# Altium footprint library elk-pi-Sika_revb.PcbLib: 102 footprints (part 1 of 7)
Each footprint in its own frame and in the unit in brackets; x right, y up, seen from the top. Pads: shape width x height; smd on the part's side, far side on the other; paste and mask are expansions set on the pad; w line width, h text height; cw(c..) or ccw(c..) is an arc to the next point about the centre after c.
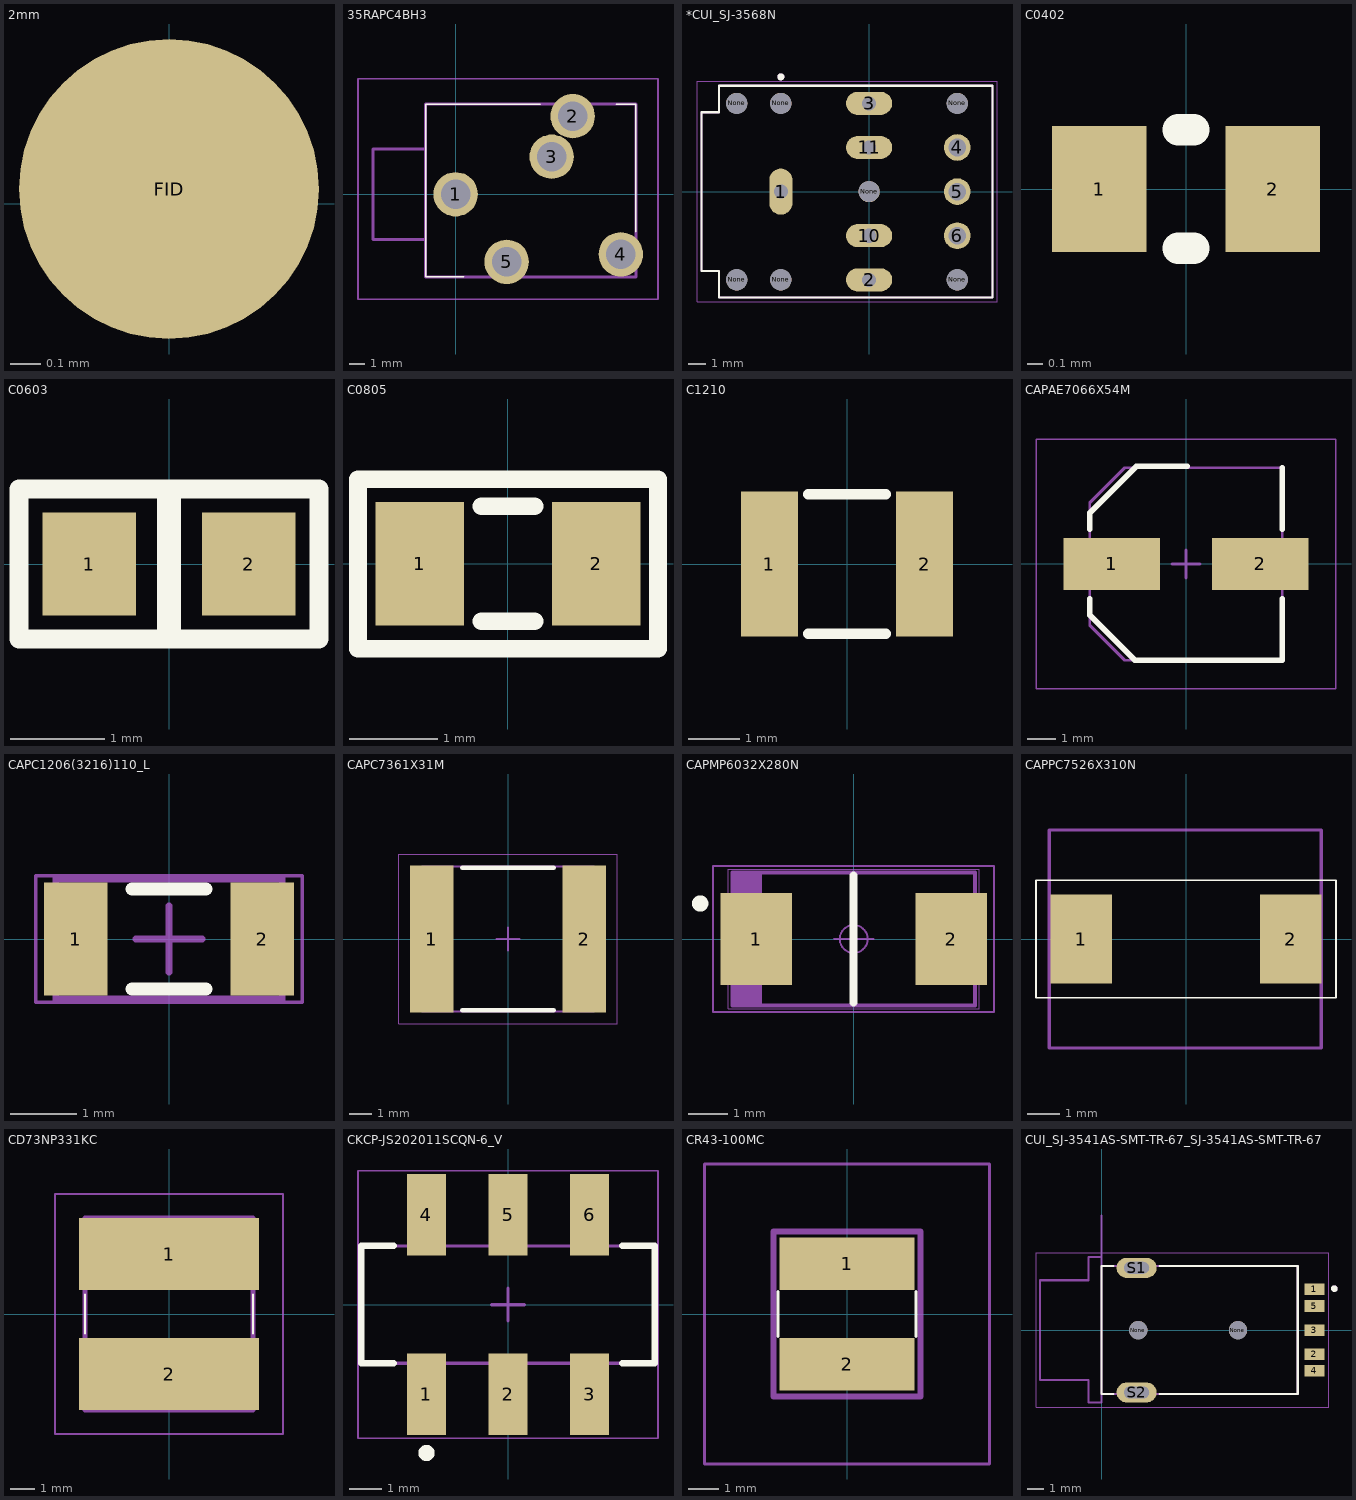
[diagram p0: the footprints below, top view; thin cyan lines are the x and y axes]

## 2mm [mm]
pads (1):
  round 1 smd paste-0.5 mask+0.5: FID(0,0.05)

## 35RAPC4BH3 [mm]
pads (5):
  round 2.955 hole 1.97: 1(0,0) 2(7.8,5.2) 3(6.4,2.5) 4(11,-4) 5(3.4,-4.5)
Top Overlay:
  lines w0.1: 0.54,-5.5 -2,-5.5 -2,6 5.62,6 ; 10.7,6 12,6 12,-2.5
Mechanical 15:
  lines w0.2: -2,-3 -5.5,-3 -5.5,3 -2,3 ; -2,-5.5 -2,6 12,6 12,-5.5 -2,-5.5
Mechanical 20:
  lines w0.1: -6.5,-6.977 -6.5,7.677 13.477,7.677 13.477,-6.977 -6.5,-6.977
3D body "35RAPC4BH3.STEP": height 6.01, standoff -2.49, extent -5.448,-5.531 12.052,5.969

## *CUI_SJ-3568N [mm]
pads (15):
  oval 1.308x2.616 hole 0.8: 1(-5,0)
  oval 2.616x1.308 hole 0.8: 2(0,-5) 3(0,5) 10(0,-2.5) 11(0,2.5)
  round 1.508 hole 1: 4(5,2.5) 5(5,0) 6(5,-2.5)
  round 1.2 hole 1.2 unplated: None(-7.5,-5) None(-7.5,5) None(-5,-5) None(-5,5) None(0,0) None(5,-5) None(5,5)
Top Overlay:
  circle w0.2: c-5,6.5 r0.1
  lines w0.127: -9.5,-4.5 -9.5,4.5 -8.5,4.5 -8.5,6 7,6 7,-6 -8.5,-6 -8.5,-4.5 -9.5,-4.5
Mechanical 1:
  lines w0: -5.4,-0.75 -4.6,-0.75 -4.6,0.75 -5.4,0.75 -5.4,-0.75 ; -0.75,-5.4 0.75,-5.4 0.75,-4.6 -0.75,-4.6 -0.75,-5.4 ; -0.75,-2.9 0.75,-2.9 0.75,-2.1 -0.75,-2.1 -0.75,-2.9 ; -0.75,2.1 0.75,2.1 0.75,2.9 -0.75,2.9 -0.75,2.1 ; -0.75,4.6 0.75,4.6 0.75,5.4 -0.75,5.4 -0.75,4.6
Mechanical 4:
  circle w0.2: c-5,6.5 r0.1
  circle w0.2: c-5,6.5 r0.1
  lines w0.127: -9.5,-4.5 -8.5,-4.5 ; -9.5,-4.5 -9.5,4.5 ; -9.5,-4.5 -8.5,-4.5 ; -9.5,-4.5 -9.5,4.5 ; -9.5,4.5 -8.5,4.5 ; -9.5,4.5 -8.5,4.5 ; -8.5,-6 7,-6 ; -8.5,-6 -8.5,-4.5 ; -8.5,-6 7,-6 ; -8.5,-6 -8.5,-4.5 ; -8.5,4.5 -8.5,6 ; -8.5,4.5 -8.5,6 ; -8.5,6 7,6 ; -8.5,6 7,6 ; 7,-6 7,6 ; 7,-6 7,6
Mechanical 16:
  lines w0.05: -9.75,-6.25 7.25,-6.25 7.25,6.25 -9.75,6.25 -9.75,-6.25
3D body "CUI_SJ-3568N.step": height 5.51, standoff -3.29, extent -11.475,-6.05 7.025,5.95

## C0402 [mm]
pads (2):
  rect 0.6x0.8 smd: 1(-0.55,0) 2(0.55,0)
Top Overlay:
  lines w0.2: -0.05,-0.375 0.05,-0.375 ; -0.05,0.375 0.05,0.375
Mechanical 6:
  text ".designator" at -0.95,0.15 h0.4
  text ".comment" at -0.55,-0.35 h0.6
3D body: height 0.49, standoff -0.01, extent -0.5,-0.25 0.5,0.25

## C0603 [mm]
pads (2):
  rect 1x1.1 smd: 1(-0.85,0) 2(0.85,0)
Top Overlay:
  lines w0.2: -1.6,-0.8 -1.6,0.8 1.6,0.8 1.6,-0.8 -1.6,-0.8
  lines w0.254: 0,-0.7 0,0.7
3D body "Ceramic CAP0603.stp": height 0.6, standoff 0, extent -0.801,-0.4 0.801,0.4

## C0805 [mm]
pads (2):
  rect 1x1.4 smd: 1(-1,0) 2(1,0)
Top Overlay:
  lines w0.2: -0.3,-0.65 0.3,-0.65 ; -0.3,0.65 0.3,0.65 ; -1.7,-0.965 1.7,-0.965 1.7,0.96 -1.7,0.96 -1.7,-0.965
Mechanical 6:
  text ".designator" at -0.6,0 h0.6
  text ".comment" at -0.3,-0.55 h0.6
3D body: height 0.59, standoff -0.01, extent -1,-0.625 1,0.625

## C1210 [mm]
pads (2):
  rect 1.1x2.8 smd: 1(-1.5,0) 2(1.5,0)
Top Overlay:
  lines w0.2: -0.75,-1.35 0.75,-1.35 ; -0.75,1.35 0.75,1.35
Mechanical 6:
  text ".designator" at -0.45,0.35 h0.6
  text ".comment" at -0.4,-0.65 h0.6
3D body: height 0.77, standoff -0.01, extent -1.6,-1.25 1.6,1.25

## CAPAE7066X54M [mm]
pads (2):
  rect 3.4x1.85 smd: 1(-2.625,0) 2(2.625,0)
Top Overlay:
  lines w0.2: -3.4,-1.225 -3.4,-1.807 -1.807,-3.4 3.4,-3.4 3.4,-1.225 ; -3.4,1.225 -3.4,1.807 -1.757,3.45 0.05,3.45 ; 3.4,1.225 3.4,3.4
Mechanical 13:
  lines w0.1: -3.4,-2.163 -2.163,-3.4 3.4,-3.4 3.4,3.4 -2.163,3.4 -3.4,2.163 -3.4,-2.163
Mechanical 15:
  lines w0.05: -5.3,-4.4 -5.3,4.4 5.3,4.4 5.3,-4.4 -5.3,-4.4
  lines w0.1: -0.5,0 0.5,0 ; 0,-0.5 0,0.5
3D body "6.3x5.4_Chip.stp": height 5.1, standoff -0.3, extent -3.5,-3.3 3.5,3.3

## CAPC1206(3216)110_L [mm] "Chip Capacitor, Body 3.2x1.6mm, Height 1.1mm, IPC High Density"
height 1.1
pads (2):
  rect 0.95x1.7 smd: 1(-1.4,0) 2(1.4,0)
Top Overlay:
  lines w0.2: -0.55,-0.75 0.55,-0.75 ; -0.55,0.75 0.55,0.75
Mechanical 13:
  lines w0.1: -1.7,-0.9 1.7,-0.9 1.7,0.9 -1.7,0.9 -1.7,-0.9
Mechanical 15:
  lines w0.05: -2,-0.95 2,-0.95 2,0.95 -2,0.95 -2,-0.95
  lines w0.1: -0.5,0 0.5,0 ; 0,-0.5 0,0.5
3D body: height 1.1, standoff 0, extent 1.2,-0.9 1.7,0.9
3D body: height 1.1, standoff 0, extent -1.7,-0.9 -1.2,0.9
3D body: height 1.1, standoff 0, extent -1.2,-0.9 1.2,0.9

## CAPC7361X31M [mm]
pads (2):
  rect 1.95x6.6 smd: 1(-3.425,0) 2(3.425,0)
Top Overlay:
  lines w0.2: -2.05,-3.2 2.05,-3.2 ; -2.05,3.2 2.05,3.2
Mechanical 13:
  lines w0.1: -3.85,-3.25 -3.85,3.25 3.85,3.25 3.85,-3.25 -3.85,-3.25
Mechanical 15:
  lines w0.05: -4.9,-3.8 -4.9,3.8 4.9,3.8 4.9,-3.8 -4.9,-3.8
  lines w0.1: -0.5,0 0.5,0 ; 0,-0.5 0,0.5
3D body: height 3.1, standoff 0, extent -3.85,-3.25 -3.25,3.25
3D body: height 3.1, standoff 0, extent 3.25,-3.25 3.85,3.25
3D body: height 3.1, standoff 0, extent -3.25,-3.25 3.25,3.25

## CAPMP6032X280N [mm]
pads (2):
  rect 1.8x2.3 smd: 1(-2.45,0) 2(2.45,0)
Top Overlay:
  circle w0.25: c-3.857,0.891 r0.08
  lines w0.2: 0,-1.6 0,1.6
Mechanical 1:
  circle w0.05: c0,0 r0.35
  lines w0.05: -0.5,0 0.5,0 ; 0,-0.5 0,0.5 ; -3.53,-1.83 -3.53,1.83 3.53,1.83 3.53,-1.83 -3.53,-1.83
Mechanical 2:
  lines w0.001: -3.15,-1.75 3.15,-1.75 3.15,1.75 -3.15,1.75 -3.15,-1.75
Mechanical 3:
  lines w0.1: -2.95,-1.67 -2.95,1.67 ; -2.85,-1.67 -2.85,1.67 ; -2.75,-1.67 -2.75,1.67 ; -2.65,-1.67 -2.65,1.67 ; -2.55,-1.67 -2.55,1.67 ; -2.45,-1.67 -2.45,1.67 ; -2.35,-1.67 -2.35,1.67 ; -3.05,-1.67 3.05,-1.67 3.05,1.67 -3.05,1.67 -3.05,-1.67
3D body: height 2.8, standoff 0, extent -3.15,-1.75 -2.25,1.75
3D body: height 2.8, standoff 0, extent -2.25,-1.75 3.15,1.75

## CAPPC7526X310N [mm]
pads (2):
  rect 1.9x2.75 smd: 1(-3.251,0) 2(3.25,0)
Top Overlay:
  lines w0.05: -4.65,-1.825 -4.65,1.825 4.65,1.825 4.65,-1.825 -4.65,-1.825
Mechanical 15:
  lines w0.1: -4.242,-3.378 4.191,-3.378 4.191,3.378 -4.242,3.378 -4.242,1.238 -4.242,-1.111 -4.242,-3.378

## CD73NP331KC [mm]
pads (2):
  rect 7.5x3 smd: 1(0,2.5) 2(0,-2.5)
Top Overlay:
  lines w0.1: -3.5,-0.8 -3.5,0.8 ; 3.5,-0.8 3.5,0.8
Mechanical 15:
  lines w0.2: -3.5,-4 3.5,-4 3.5,4 -3.5,4 -3.5,-4
Mechanical 20:
  lines w0.1: -4.75,-5 4.75,-5 4.75,5 -4.75,5 -4.75,-5

## CKCP-JS202011SCQN-6_V [mm] "SMD, 6-Leads, Body 9x3.6mm, Pitch 2.5mm"
height 5.5
pads (6):
  rect 1.2x2.5 smd: 1(-2.5,-2.75) 2(0,-2.75) 3(2.5,-2.75) 4(-2.5,2.75) 5(0,2.75) 6(2.5,2.75)
Top Overlay:
  circle w0.25: c-2.5,-4.55 r0.125
  lines w0.2: -3.5,-1.8 -4.5,-1.8 -4.5,1.8 -3.5,1.8 ; 3.5,-1.8 4.5,-1.8 4.5,1.8 3.5,1.8
Mechanical 13:
  lines w0.1: -4.5,-1.8 -4.5,1.8 4.5,1.8 4.5,-1.8 -4.5,-1.8
Mechanical 15:
  lines w0.05: -4.6,-4.1 4.6,-4.1 4.6,4.1 -4.6,4.1 -4.6,-4.1
  lines w0.1: -0.5,0 0.5,0 ; 0,-0.5 0,0.5
3D body: height 3.5, standoff 0, extent -4.5,-1.8 4.5,1.8
3D body: height 5.5, standoff 3.5, extent -2.249,-0.749 -0.751,0.749

## CR43-100MC [mm]
pads (2):
  rect 4.5x1.75 smd: 1(0,1.67) 2(0,-1.67)
Top Overlay:
  lines w0.1: -2.3,-0.75 -2.3,0.75 ; 2.3,-0.75 2.3,0.75
Mechanical 15:
  lines w0.2: -2.45,-2.75 2.45,-2.75 2.45,2.75 -2.45,2.75 -2.45,-2.75
Mechanical 20:
  lines w0.1: -4.75,-5 4.75,-5 4.75,5 -4.75,5 -4.75,-5

## CUI_SJ-3541AS-SMT-TR-67_SJ-3541AS-SMT-TR-67 [mm]
pads (9):
  rect 1.2x0.7 smd: 1(12.8,2.45) 2(12.8,-1.45) 3(12.8,0) 4(12.8,-2.45) 5(12.8,1.45)
  round 1.1 hole 1.1 unplated: None(2.2,0) None(8.2,0)
  oval 2.416x1.208 hole 0.7 slot 1.5 at 0 deg: S1(2.1,3.75) S2(2.1,-3.75)
Top Overlay:
  circle w0.2: c14,2.5 r0.1
  lines w0.127: 0.72,-3.85 0,-3.85 0,3.85 0.72,3.85 ; 3.48,-3.85 11.8,-3.85 11.8,3.85 3.48,3.85
Mechanical 1:
  lines w0: 1.7,-4.1 cw(c1.7,-3.75) 1.7,-3.4 2.5,-3.4 cw(c2.5,-3.75) 2.5,-4.1 1.7,-4.1 ; 1.7,3.4 cw(c1.7,3.75) 1.7,4.1 2.5,4.1 cw(c2.5,3.75) 2.5,3.4 1.7,3.4
Mechanical 4:
  circle w0.2: c14,2.5 r0.1
  circle w0.2: c14,2.5 r0.1
  lines w0.127: -3.7,-3 -0.8,-3 ; -3.7,-3 -3.7,3 ; -3.7,-3 -0.8,-3 ; -3.7,-3 -3.7,3 ; -3.7,3 -0.8,3 ; -3.7,3 -0.8,3 ; -0.8,-4.35 0,-4.35 ; -0.8,-4.35 -0.8,-3 ; -0.8,-4.35 0,-4.35 ; -0.8,-4.35 -0.8,-3 ; -0.8,3 -0.8,4.4 ; -0.8,3 -0.8,4.4 ; -0.8,4.4 0,4.4 ; -0.8,4.4 0,4.4 ; 0,-4.35 0,-3.85 ; 0,-4.35 0,-3.85 ; 0,-3.85 0,3.85 ; 0,-3.85 11.8,-3.85 ; 0,-3.85 0,3.85 ; 0,-3.85 11.8,-3.85 ; 0,3.85 11.8,3.85 ; 0,3.85 0,4.4 ; 0,3.85 11.8,3.85 ; 0,3.85 0,4.4 ; 0,4.4 0,6.9 0,4.4 ; 11.8,-3.85 11.8,3.85 ; 11.8,-3.85 11.8,3.85
  text ">PCB EDGE" at -0.1,4.252 h1.88
  text ">PCB EDGE" at -0.1,4.252 h1.88
Mechanical 16:
  lines w0.05: -3.95,-4.65 -3.95,4.65 13.65,4.65 13.65,-4.65 -3.95,-4.65
3D body "CUI_SJ-3541AS-SMT-TR-67.step": height 5.31, standoff -0.89, extent -3.6,-4.4 13.2,4.4